# Altium footprint library TYCO SMD.PcbLib: 21 footprints (part 1 of 2)
Each footprint in its own frame and in the unit in brackets; x right, y up, seen from the top. Pads: shape width x height; smd on the part's side, far side on the other; paste and mask are expansions set on the pad; w line width, h text height; cw(c..) or ccw(c..) is an arc to the next point about the centre after c.
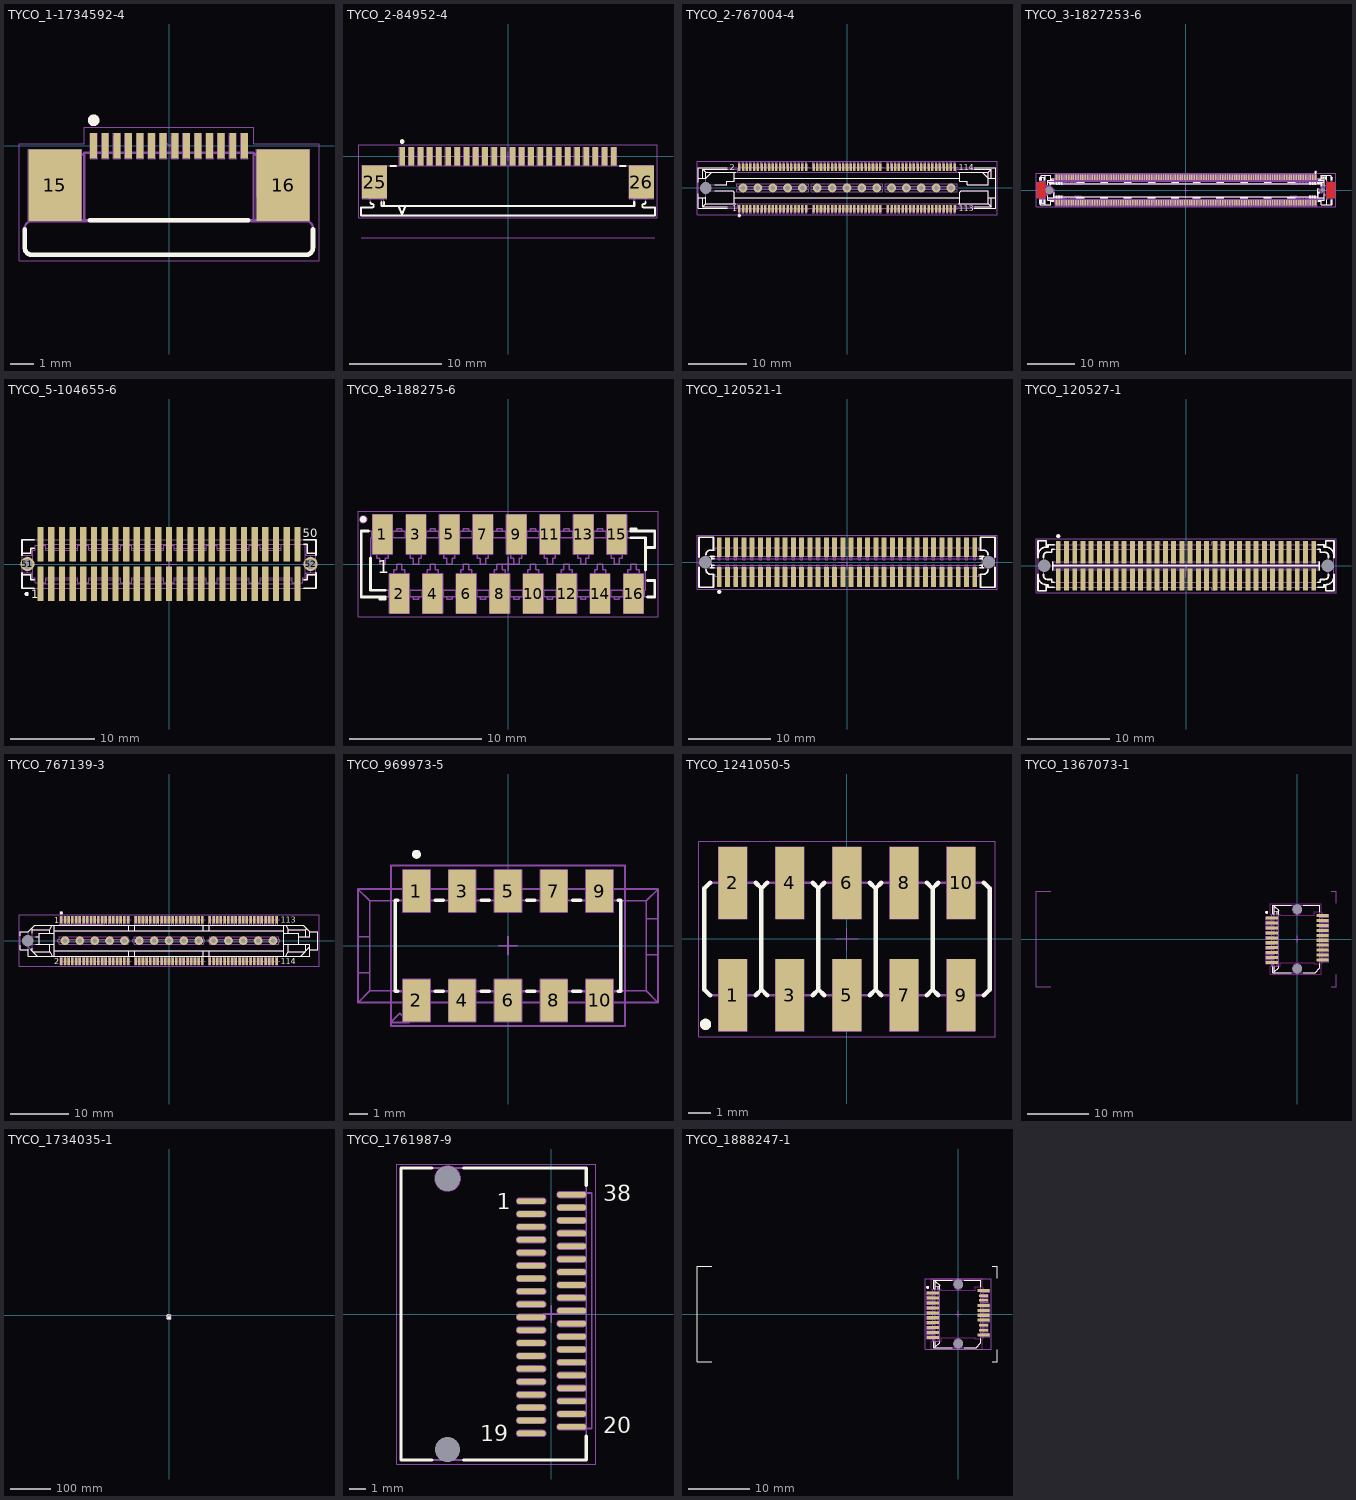
[diagram p0: the footprints below, top view; thin cyan lines are the x and y axes]

## TYCO_1-1734592-4 [mm] "14 Contacts, 0.5mm Pitch, FFC Right Angle Connector, Receptacle, ZIF, Bottom Contact Style, SMT"
height 2.05
pads (16):
  rect 0.3x1.1 smd: 1(-3.25,0) 2(-2.75,0) 3(-2.25,0) 4(-1.75,0) 5(-1.25,0) 6(-0.75,0) 7(-0.25,0) 8(0.25,0) 9(0.75,0) 10(1.25,0) 11(1.75,0) 12(2.25,0) 13(2.75,0) 14(3.25,0)
  rect 2.3x3.1 smd: 15(-4.92,-1.7) 16(4.92,-1.7)
Top Overlay:
  circle w0.25: c-3.25,1.1 r0.125
  lines w0.2: -6.22,-3.6 -6.22,-4.4 ccw(c-5.92,-4.4) -5.92,-4.7 5.91,-4.7 ccw(c5.91,-4.4) 6.21,-4.4 6.21,-3.6 ; -3.42,-3.21 3.42,-3.21
Mechanical 8:
  lines w0.05: -5.42,-1.7 -4.92,-1.7 ; -4.92,-2.2 -4.92,-1.7 ; -4.92,-1.2 -4.92,-1.7 ; -4.42,-1.7 -4.92,-1.7 ; -0.354,0.354 0,0 0.354,0.354 ; 4.42,-1.7 4.92,-1.7 ; 4.92,-2.2 4.92,-1.7 ; 4.92,-1.2 4.92,-1.7 ; 5.42,-1.7 4.92,-1.7 ; -3.4,-0.55 -3.1,-0.55 ; -3.4,-0.55 -3.4,0.55 -3.1,0.55 -3.1,-0.55 ; -3.4,-0.55 -3.25,0 -3.1,-0.55 ; -2.9,-0.55 -2.6,-0.55 ; -2.9,-0.55 -2.9,0.55 -2.6,0.55 -2.6,-0.55 ; -2.9,-0.55 -2.75,0 -2.6,-0.55 ; -2.4,-0.55 -2.1,-0.55 ; -2.4,-0.55 -2.4,0.55 -2.1,0.55 -2.1,-0.55 ; -2.4,-0.55 -2.25,0 -2.1,-0.55 ; -1.9,-0.55 -1.6,-0.55 ; -1.9,-0.55 -1.9,0.55 -1.6,0.55 -1.6,-0.55 ; -1.9,-0.55 -1.75,0 -1.6,-0.55 ; -1.4,-0.55 -1.1,-0.55 ; -1.4,-0.55 -1.4,0.55 -1.1,0.55 -1.1,-0.55 ; -1.4,-0.55 -1.25,0 -1.1,-0.55 ; -0.9,-0.55 -0.6,-0.55 ; -0.9,-0.55 -0.9,0.55 -0.6,0.55 -0.6,-0.55 ; -0.9,-0.55 -0.75,0 -0.6,-0.55 ; -0.4,-0.55 -0.1,-0.55 ; -0.4,-0.55 -0.4,0.55 -0.1,0.55 -0.1,-0.55 ; -0.4,-0.55 -0.25,0 -0.1,-0.55 ; 0.1,-0.55 0.4,-0.55 ; 0.1,-0.55 0.1,0.55 0.4,0.55 0.4,-0.55 ; 0.1,-0.55 0.25,0 0.4,-0.55 ; 0.6,-0.55 0.9,-0.55 ; 0.6,-0.55 0.6,0.55 0.9,0.55 0.9,-0.55 ; 0.6,-0.55 0.75,0 0.9,-0.55 ; 1.1,-0.55 1.4,-0.55 ; 1.1,-0.55 1.1,0.55 1.4,0.55 1.4,-0.55 ; 1.1,-0.55 1.25,0 1.4,-0.55 ; 1.6,-0.55 1.9,-0.55 ; 1.6,-0.55 1.6,0.55 1.9,0.55 1.9,-0.55 ; 1.6,-0.55 1.75,0 1.9,-0.55 ; 2.1,-0.55 2.4,-0.55 ; 2.1,-0.55 2.1,0.55 2.4,0.55 2.4,-0.55 ; 2.1,-0.55 2.25,0 2.4,-0.55 ; 2.6,-0.55 2.9,-0.55 ; 2.6,-0.55 2.6,0.55 2.9,0.55 2.9,-0.55 ; 2.6,-0.55 2.75,0 2.9,-0.55 ; 3.1,-0.55 3.4,-0.55 ; 3.1,-0.55 3.1,0.55 3.4,0.55 3.4,-0.55 ; 3.1,-0.55 3.25,0 3.4,-0.55 ; -6.07,-3.25 -3.77,-3.25 -3.77,-0.15 -6.07,-0.15 -6.07,-3.25 ; 3.77,-3.25 6.07,-3.25 6.07,-0.15 3.77,-0.15 3.77,-3.25
Mechanical 14:
  lines w0.1: -5.375,-3.25 -5.375,-0.3 ; -5.375,-3.21 5.365,-3.21 ; -5.375,-3.1 -5.47,-3.1 cw(c-5.47,-3) -5.57,-3 -5.57,-2.7 -5.42,-2.55 -5.42,-2.15 -5.57,-2 -5.57,-0.4 cw(c-5.47,-0.4) -5.47,-0.3 -3.82,-0.3 -3.82,-0.95 ; -4.035,-2.15 -4.035,-0.45 -4.185,-0.3 -4.185,-2.15 -3.805,-2.15 -3.805,-0.45 -3.655,-0.3 ; -4.035,-0.95 -3.805,-0.95 ; -3.655,-3.21 -3.655,-0.3 ; -3.35,-0.3 -3.35,0.4 -3.15,0.4 -3.15,-0.3 ; -2.85,-0.3 -2.85,0.4 -2.65,0.4 -2.65,-0.3 ; -2.35,-0.3 -2.35,0.4 -2.15,0.4 -2.15,-0.3 ; -1.85,-0.3 -1.85,0.4 -1.65,0.4 -1.65,-0.3 ; -1.35,-0.3 -1.35,0.4 -1.15,0.4 -1.15,-0.3 ; -0.85,-0.3 -0.85,0.4 -0.65,0.4 -0.65,-0.3 ; -0.35,-0.3 -0.35,0.4 -0.15,0.4 -0.15,-0.3 ; 0.15,-0.3 0.15,0.4 0.35,0.4 0.35,-0.3 ; 0.65,-0.3 0.65,0.4 0.85,0.4 0.85,-0.3 ; 1.15,-0.3 1.15,0.4 1.35,0.4 1.35,-0.3 ; 1.65,-0.3 1.65,0.4 1.85,0.4 1.85,-0.3 ; 2.15,-0.3 2.15,0.4 2.35,0.4 2.35,-0.3 ; 2.65,-0.3 2.65,0.4 2.85,0.4 2.85,-0.3 ; 3.15,-0.3 3.15,0.4 3.35,0.4 3.35,-0.3 ; 3.645,-3.21 3.645,-0.3 ; 3.795,-0.95 4.025,-0.95 ; 3.81,-0.95 3.81,-0.3 5.46,-0.3 cw(c5.46,-0.4) 5.56,-0.4 5.56,-2 5.41,-2.15 5.41,-2.55 5.56,-2.7 5.56,-3 cw(c5.46,-3) 5.46,-3.1 5.365,-3.1 ; 4.025,-2.15 4.025,-0.45 4.175,-0.3 4.175,-2.15 3.795,-2.15 3.795,-0.45 3.645,-0.3 ; 5.365,-3.25 5.365,-0.3 ; -3.655,-0.3 3.645,-0.3 ; -6.22,-4.4 ccw(c-5.92,-4.4) -5.92,-4.7 5.91,-4.7 ccw(c5.91,-4.4) 6.21,-4.4 6.21,-3.55 ccw(c5.91,-3.55) 5.91,-3.25 -5.92,-3.25 ccw(c-5.92,-3.55) -6.22,-3.55 -6.22,-4.4
Mechanical 15:
  lines w0.05: -6.47,-4.95 -6.47,0.1 -3.65,0.1 -3.65,0.8 3.65,0.8 3.65,0.1 6.47,0.1 6.47,-4.95 -6.47,-4.95
3D body "TYCO_1-1734592-4.stp": height 2.05, standoff 0, extent -6.22,-4.71 6.21,0.4

## TYCO_2-84952-4 [mm] "24 Contacts, 1mm Pitch, FFC Right Angle Connector, Receptacle, ZIF, Bottom Contact Style, SMT"
height 2.74
pads (26):
  rect 0.6x2 smd: 1(-11.5,0) 2(-10.5,0) 3(-9.5,0) 4(-8.5,0) 5(-7.5,0) 6(-6.5,0) 7(-5.5,0) 8(-4.5,0) 9(-3.5,0) 10(-2.5,0) 11(-1.5,0) 12(-0.5,0) 13(0.5,0) 14(1.5,0) 15(2.5,0) 16(3.5,0) 17(4.5,0) 18(5.5,0) 19(6.5,0) 20(7.5,0) 21(8.5,0) 22(9.5,0) 23(10.5,0) 24(11.5,0)
  rect 2.7x3.6 smd: 25(-14.5,-2.8) 26(14.5,-2.8)
Top Overlay:
  circle w0.25: c-11.5,1.6 r0.125
  lines w0.2: -14.945,-5.025 ccw(c-14.765,-5.025) -14.765,-5.205 cw(c-14.765,-5.385) -14.765,-5.565 -15.965,-5.565 -15.965,-6.455 15.965,-6.455 15.965,-5.565 14.765,-5.565 cw(c14.765,-5.385) 14.765,-5.205 ccw(c14.765,-5.025) 14.945,-5.025 14.945,-4.95 ; -13.755,-4.985 -13.755,-5.335 ccw(c-13.675,-5.335) -13.675,-5.415 -13.475,-5.415 ; -13.475,-4.95 -13.475,-5.425 13.675,-5.425 13.675,-4.95 ; -12.8,-1.045 -12.155,-1.045 ; -11.905,-5.425 -11.525,-6.305 -11.145,-5.425 ; 12.155,-1.045 12.8,-1.045 ; 13.675,-5.415 ccw(c13.675,-5.335) 13.755,-5.335 13.755,-4.985
Mechanical 8:
  drawing of 211 lines, arcs and shapes, not listed
Mechanical 14:
  drawing of 196 lines, arcs and shapes, not listed
Mechanical 15:
  lines w0.05: -16.215,-6.705 -16.215,1.25 16.215,1.25 16.215,-6.705 -16.215,-6.705
3D body "TYCO_2-84952-4.stp": height 2.56, standoff 0, extent -15.965,-6.455 15.965,0.085

## TYCO_2-767004-4 [mm] "114 Positions, Pitch 25 [0.64], Centerline Matched Impedance Vertical Receptacle (MICTOR)"
height 6.35
pads (130):
  rect 0.43x1.27 smd: 1(-18.415,-3.531) 2(-18.415,3.531) 3(-17.78,-3.531) 4(-17.78,3.531) 5(-17.145,-3.531) 6(-17.145,3.531) 7(-16.51,-3.531) 8(-16.51,3.531) 9(-15.875,-3.531) 10(-15.875,3.531) 11(-15.24,-3.531) 12(-15.24,3.531) 13(-14.605,-3.531) 14(-14.605,3.531) 15(-13.97,-3.531) 16(-13.97,3.531) 17(-13.335,-3.531) 18(-13.335,3.531) 19(-12.7,-3.531) 20(-12.7,3.531) 21(-12.065,-3.531) 22(-12.065,3.531) 23(-11.43,-3.531) 24(-11.43,3.531) 25(-10.795,-3.531) 26(-10.795,3.531) 27(-10.16,-3.531) 28(-10.16,3.531) 29(-9.525,-3.531) 30(-9.525,3.531) 31(-8.89,-3.531) 32(-8.89,3.531) 33(-8.255,-3.531) 34(-8.255,3.531) 35(-7.62,-3.531) 36(-7.62,3.531) 37(-6.985,-3.531) 38(-6.985,3.531) 39(-5.715,-3.531) 40(-5.715,3.531) 41(-5.08,-3.531) 42(-5.08,3.531) 43(-4.445,-3.531) 44(-4.445,3.531) 45(-3.81,-3.531) 46(-3.81,3.531) 47(-3.175,-3.531) 48(-3.175,3.531) 49(-2.54,-3.531) 50(-2.54,3.531) 51(-1.905,-3.531) 52(-1.905,3.531) 53(-1.27,-3.531) 54(-1.27,3.531) 55(-0.635,-3.531) 56(-0.635,3.531) 57(0,-3.531) 58(0,3.531) 59(0.635,-3.531) 60(0.635,3.531) 61(1.27,-3.531) 62(1.27,3.531) 63(1.905,-3.531) 64(1.905,3.531) 65(2.54,-3.531) 66(2.54,3.531) 67(3.175,-3.531) 68(3.175,3.531) 69(3.81,-3.531) 70(3.81,3.531) 71(4.445,-3.531) 72(4.445,3.531) 73(5.08,-3.531) 74(5.08,3.531) 75(5.715,-3.531) 76(5.715,3.531) 77(6.985,-3.531) 78(6.985,3.531) 79(7.62,-3.531) 80(7.62,3.531) 81(8.255,-3.531) 82(8.255,3.531) 83(8.89,-3.531) 84(8.89,3.531) 85(9.525,-3.531) 86(9.525,3.531) 87(10.16,-3.531) 88(10.16,3.531) 89(10.795,-3.531) 90(10.795,3.531) 91(11.43,-3.531) 92(11.43,3.531) 93(12.065,-3.531) 94(12.065,3.531) 95(12.7,-3.531) 96(12.7,3.531) 97(13.335,-3.531) 98(13.335,3.531) 99(13.97,-3.531) 100(13.97,3.531) 101(14.605,-3.531) 102(14.605,3.531) 103(15.24,-3.531) 104(15.24,3.531) 105(15.875,-3.531) 106(15.875,3.531) 107(16.51,-3.531) 108(16.51,3.531) 109(17.145,-3.531) 110(17.145,3.531) 111(17.78,-3.531) 112(17.78,3.531) 113(18.415,-3.531) 114(18.415,3.531)
  round 1.5 hole 0.8: 115(17.78,0) 116(15.24,0) 117(12.7,0) 118(10.16,0) 119(7.62,0) 120(5.08,0) 121(2.54,0) 122(0,0) 123(-2.54,0) 124(-5.08,0) 125(-7.62,0) 126(-10.16,0) 127(-12.7,0) 128(-15.24,0) 129(-17.78,0)
  round 0.5 hole 2 unplated mask+0.75: 130(-24.13,0)
Top Overlay:
  circle w0.25: c-18.415,-4.716 r0.125
  lines w0.2: -25.4,-1.676 -24.13,-1.676 ; -25.4,-0.973 -25.4,-3.454 -20.5,-3.454 ; -25.4,0.973 -25.4,3.454 -20.5,3.454 ; -25.4,1.676 -24.13,1.676 -23.114,2.692 ; -24.638,-1.676 -24.638,-3.2 ; -24.638,1.676 -24.638,3.2 ; -24.13,-1.6 -24.13,-2.692 ; -24.13,1.6 -24.13,2.692 ; -22.613,-0.508 -19.507,-0.508 -19.253,-0.762 -19.253,-2.692 ; -22.613,0.508 -20.523,0.508 -20.523,1.143 -19.253,1.143 -19.253,2.692 ; -20.5,-3.2 -24.638,-3.2 ; -20.5,3.2 -24.638,3.2 ; -19.253,-1.676 19.253,-1.676 ; -19.253,1.676 19.253,1.676 ; -19.03,-2.692 -24.13,-2.692 ; -19.03,2.692 -24.13,2.692 ; 19.03,-2.692 24.13,-2.692 ; 19.03,2.692 24.13,2.692 ; 19.253,-2.692 19.253,-0.762 19.507,-0.508 24.13,-0.508 24.13,-2.692 ; 19.253,2.692 19.253,1.143 20.523,1.143 20.523,0.508 24.13,0.508 24.13,2.692 ; 21.8,-3.454 25.4,-3.454 25.4,3.454 21.8,3.454 ; 21.8,-3.2 24.638,-3.2 ; 21.8,3.2 24.638,3.2 ; 23.114,2.692 24.13,1.676 25.4,1.676 ; 24.13,-1.676 25.4,-1.676 ; 24.638,-1.676 24.638,-3.2 ; 24.638,1.676 24.638,3.2 ; -24.638,-3.2 -24.13,-2.692 ; -24.638,3.2 -24.13,2.692 ; 24.13,-2.692 24.638,-3.2 ; 24.13,2.692 24.638,3.2
  text "114" at 19.075,3.05 h1
  text "113" at 19.1,-4.025 h1
  text "2" at -20.05,3.05 h1
  text "1" at -19.6,-4.025 h1
Mechanical 8:
  drawing of 406 lines, arcs and shapes, not listed
Mechanical 14:
  drawing of 415 lines, arcs and shapes, not listed
Mechanical 15:
  lines w0.05: -25.65,-4.606 -25.65,4.606 25.65,4.606 25.65,-4.606 -25.65,-4.606
3D body "TYCO_2-767004-4.stp": height 6.1, standoff -1.3, extent -25.4,-4.356 25.4,4.356

## TYCO_3-1827253-6 [mm] "220 Positions, 0.5mm Pitch, Surface Mount, Board-to-Board Plug Connector with Ground Plate"
height 4.45
pads (222):
  rect 0.45x1.2 smd: 1(27.325,2.7) 2(27.325,-2.7) 219(-27.325,2.7) 220(-27.325,-2.7)
  rect 0.3x1.2 smd: 3(26.75,2.7) 4(26.75,-2.7) 5(26.25,2.7) 6(26.25,-2.7) 7(25.75,2.7) 8(25.75,-2.7) 9(25.25,2.7) 10(25.25,-2.7) 11(24.75,2.7) 12(24.75,-2.7) 13(24.25,2.7) 14(24.25,-2.7) 15(23.75,2.7) 16(23.75,-2.7) 17(23.25,2.7) 18(23.25,-2.7) 19(22.75,2.7) 20(22.75,-2.7) 21(22.25,2.7) 22(22.25,-2.7) 23(21.75,2.7) 24(21.75,-2.7) 25(21.25,2.7) 26(21.25,-2.7) 27(20.75,2.7) 28(20.75,-2.7) 29(20.25,2.7) 30(20.25,-2.7) 31(19.75,2.7) 32(19.75,-2.7) 33(19.25,2.7) 34(19.25,-2.7) 35(18.75,2.7) 36(18.75,-2.7) 37(18.25,2.7) 38(18.25,-2.7) 39(17.75,2.7) 40(17.75,-2.7) 41(17.25,2.7) 42(17.25,-2.7) 43(16.75,2.7) 44(16.75,-2.7) 45(16.25,2.7) 46(16.25,-2.7) 47(15.75,2.7) 48(15.75,-2.7) 49(15.25,2.7) 50(15.25,-2.7) 51(14.75,2.7) 52(14.75,-2.7) 53(14.25,2.7) 54(14.25,-2.7) 55(13.75,2.7) 56(13.75,-2.7) 57(13.25,2.7) 58(13.25,-2.7) 59(12.75,2.7) 60(12.75,-2.7) 61(12.25,2.7) 62(12.25,-2.7) 63(11.75,2.7) 64(11.75,-2.7) 65(11.25,2.7) 66(11.25,-2.7) 67(10.75,2.7) 68(10.75,-2.7) 69(10.25,2.7) 70(10.25,-2.7) 71(9.75,2.7) 72(9.75,-2.7) 73(9.25,2.7) 74(9.25,-2.7) 75(8.75,2.7) 76(8.75,-2.7) 77(8.25,2.7) 78(8.25,-2.7) 79(7.75,2.7) 80(7.75,-2.7) 81(7.25,2.7) 82(7.25,-2.7) 83(6.75,2.7) 84(6.75,-2.7) 85(6.25,2.7) 86(6.25,-2.7) 87(5.75,2.7) 88(5.75,-2.7) 89(5.25,2.7) 90(5.25,-2.7) 91(4.75,2.7) 92(4.75,-2.7) 93(4.25,2.7) 94(4.25,-2.7) 95(3.75,2.7) 96(3.75,-2.7) 97(3.25,2.7) 98(3.25,-2.7) 99(2.75,2.7) 100(2.75,-2.7) 101(2.25,2.7) 102(2.25,-2.7) 103(1.75,2.7) 104(1.75,-2.7) 105(1.25,2.7) 106(1.25,-2.7) 107(0.75,2.7) 108(0.75,-2.7) 109(0.25,2.7) 110(0.25,-2.7) 111(-0.25,2.7) 112(-0.25,-2.7) 113(-0.75,2.7) 114(-0.75,-2.7) 115(-1.25,2.7) 116(-1.25,-2.7) 117(-1.75,2.7) 118(-1.75,-2.7) 119(-2.25,2.7) 120(-2.25,-2.7) 121(-2.75,2.7) 122(-2.75,-2.7) 123(-3.25,2.7) 124(-3.25,-2.7) 125(-3.75,2.7) 126(-3.75,-2.7) 127(-4.25,2.7) 128(-4.25,-2.7) 129(-4.75,2.7) 130(-4.75,-2.7) 131(-5.25,2.7) 132(-5.25,-2.7) 133(-5.75,2.7) 134(-5.75,-2.7) 135(-6.25,2.7) 136(-6.25,-2.7) 137(-6.75,2.7) 138(-6.75,-2.7) 139(-7.25,2.7) 140(-7.25,-2.7) 141(-7.75,2.7) 142(-7.75,-2.7) 143(-8.25,2.7) 144(-8.25,-2.7) 145(-8.75,2.7) 146(-8.75,-2.7) 147(-9.25,2.7) 148(-9.25,-2.7) 149(-9.75,2.7) 150(-9.75,-2.7) 151(-10.25,2.7) 152(-10.25,-2.7) 153(-10.75,2.7) 154(-10.75,-2.7) 155(-11.25,2.7) 156(-11.25,-2.7) 157(-11.75,2.7) 158(-11.75,-2.7) 159(-12.25,2.7) 160(-12.25,-2.7) 161(-12.75,2.7) 162(-12.75,-2.7) 163(-13.25,2.7) 164(-13.25,-2.7) 165(-13.75,2.7) 166(-13.75,-2.7) 167(-14.25,2.7) 168(-14.25,-2.7) 169(-14.75,2.7) 170(-14.75,-2.7) 171(-15.25,2.7) 172(-15.25,-2.7) 173(-15.75,2.7) 174(-15.75,-2.7) 175(-16.25,2.7) 176(-16.25,-2.7) 177(-16.75,2.7) 178(-16.75,-2.7) 179(-17.25,2.7) 180(-17.25,-2.7) 181(-17.75,2.7) 182(-17.75,-2.7) 183(-18.25,2.7) 184(-18.25,-2.7) 185(-18.75,2.7) 186(-18.75,-2.7) 187(-19.25,2.7) 188(-19.25,-2.7) 189(-19.75,2.7) 190(-19.75,-2.7) 191(-20.25,2.7) 192(-20.25,-2.7) 193(-20.75,2.7) 194(-20.75,-2.7) 195(-21.25,2.7) 196(-21.25,-2.7) 197(-21.75,2.7) 198(-21.75,-2.7) 199(-22.25,2.7) 200(-22.25,-2.7) 201(-22.75,2.7) 202(-22.75,-2.7) 203(-23.25,2.7) 204(-23.25,-2.7) 205(-23.75,2.7) 206(-23.75,-2.7) 207(-24.25,2.7) 208(-24.25,-2.7) 209(-24.75,2.7) 210(-24.75,-2.7) 211(-25.25,2.7) 212(-25.25,-2.7) 213(-25.75,2.7) 214(-25.75,-2.7) 215(-26.25,2.7) 216(-26.25,-2.7) 217(-26.75,2.7) 218(-26.75,-2.7)
  round 0.5 hole 1.6 unplated mask+0.55: MECH(-28.85,0)
  round 0.5 hole 0.9 unplated mask+0.2: MECH(28.85,0)
Top Layer:
  region: -31.4,-1.65 -31.4,1.65 -29.75,1.65 -29.75,0.436 -29.793,0.332 -29.844,0.113 -29.844,-0.113 -29.793,-0.332 -29.75,-0.436 -29.75,-1.65
  region: 31.4,1.65 31.4,-1.65 29.75,-1.65 29.75,-0.436 29.793,-0.332 29.844,-0.113 29.844,0.113 29.793,0.332 29.75,0.436 29.75,1.65
Top Overlay:
  drawing of 347 lines, arcs and shapes, not listed
Mechanical 8:
  drawing of 1362 lines, arcs and shapes, not listed
Mechanical 14:
  drawing of 1384 lines, arcs and shapes, not listed
Mechanical 15:
  lines w0.05: -31.65,-3.55 31.65,-3.55 31.65,3.55 -31.65,3.55 -31.65,-3.55
3D body "TYCO_3-1827253-6.stp": height 4.45, standoff -0.6, extent -30.9,-3.1 30.9,3.1

## TYCO_5-104655-6 [mm] "2x25 Position, 1.27mm Pitch, Surface Mount, AMPMODU Male Connector"
height 5.78
pads (52):
  rect 0.75x4.1 smd: 1(-15.24,-2.33) 2(-15.24,2.33) 3(-13.97,-2.33) 4(-13.97,2.33) 5(-12.7,-2.33) 6(-12.7,2.33) 7(-11.43,-2.33) 8(-11.43,2.33) 9(-10.16,-2.33) 10(-10.16,2.33) 11(-8.89,-2.33) 12(-8.89,2.33) 13(-7.62,-2.33) 14(-7.62,2.33) 15(-6.35,-2.33) 16(-6.35,2.33) 17(-5.08,-2.33) 18(-5.08,2.33) 19(-3.81,-2.33) 20(-3.81,2.33) 21(-2.54,-2.33) 22(-2.54,2.33) 23(-1.27,-2.33) 24(-1.27,2.33) 25(0,-2.33) 26(0,2.33) 27(1.27,-2.33) 28(1.27,2.33) 29(2.54,-2.33) 30(2.54,2.33) 31(3.81,-2.33) 32(3.81,2.33) 33(5.08,-2.33) 34(5.08,2.33) 35(6.35,-2.33) 36(6.35,2.33) 37(7.62,-2.33) 38(7.62,2.33) 39(8.89,-2.33) 40(8.89,2.33) 41(10.16,-2.33) 42(10.16,2.33) 43(11.43,-2.33) 44(11.43,2.33) 45(12.7,-2.33) 46(12.7,2.33) 47(13.97,-2.33) 48(13.97,2.33) 49(15.24,-2.33) 50(15.24,2.33)
  round 1.7 hole 1.2: 51(-16.79,0) 52(16.79,0)
Top Overlay:
  circle w0.25: c-16.889,-3.556 r0.125
  lines w0.2: -17.424,-1.27 -16.408,-1.27 -16.408,-1.867 -16.015,-1.867 ; -17.424,-1.077 -17.424,-2.858 -16.015,-2.858 ; -17.424,1.077 -17.424,2.858 -16.015,2.858 ; -17.424,1.27 -16.408,1.27 -16.408,1.867 -16.015,1.867 ; 16.015,-2.858 17.424,-2.858 17.424,-1.077 ; 16.015,-1.867 16.408,-1.867 16.408,-1.27 17.424,-1.27 ; 16.015,2.324 16.408,2.324 16.408,1.27 17.424,1.27 ; 16.015,2.858 17.424,2.858 17.424,1.077
  text "50" at 15.868,3.168 h1
  text "1" at -16.328,-4.081 h1
Mechanical 8:
  lines w0.1: -17.79,0 -16.79,0 ; -16.79,-1 -16.79,0 ; -16.79,1 -16.79,0 ; -15.79,0 -16.79,0 ; -15.24,-3.33 -15.24,-2.33 ; -15.24,-1.33 -15.24,-2.33 ; -15.24,1.33 -15.24,2.33 ; -15.24,3.33 -15.24,2.33 ; -13.97,-3.33 -13.97,-2.33 -13.97,-1.33 ; -13.97,1.33 -13.97,2.33 -13.97,3.33 ; -12.7,-3.33 -12.7,-2.33 -12.7,-1.33 ; -12.7,1.33 -12.7,2.33 -12.7,3.33 ; -11.43,-3.33 -11.43,-2.33 -11.43,-1.33 ; -11.43,1.33 -11.43,2.33 -11.43,3.33 ; -10.16,-3.33 -10.16,-2.33 -10.16,-1.33 ; -10.16,1.33 -10.16,2.33 -10.16,3.33 ; -8.89,-3.33 -8.89,-2.33 -8.89,-1.33 ; -8.89,1.33 -8.89,2.33 -8.89,3.33 ; -7.62,-3.33 -7.62,-2.33 -7.62,-1.33 ; -7.62,1.33 -7.62,2.33 -7.62,3.33 ; -6.35,-3.33 -6.35,-2.33 -6.35,-1.33 ; -6.35,1.33 -6.35,2.33 -6.35,3.33 ; -5.08,-3.33 -5.08,-2.33 -5.08,-1.33 ; -5.08,1.33 -5.08,2.33 -5.08,3.33 ; -3.81,-3.33 -3.81,-2.33 -3.81,-1.33 ; -3.81,1.33 -3.81,2.33 -3.81,3.33 ; -2.54,-3.33 -2.54,-2.33 -2.54,-1.33 ; -2.54,1.33 -2.54,2.33 -2.54,3.33 ; -1.27,-3.33 -1.27,-2.33 -1.27,-1.33 ; -1.27,1.33 -1.27,2.33 -1.27,3.33 ; -1,0 0,0 ; 0,-3.33 0,-2.33 0,-1.33 ; 0,-1 0,0 ; 0,1 0,0 ; 0,1.33 0,2.33 0,3.33 ; 1,0 0,0 ; 1.27,-3.33 1.27,-2.33 1.27,-1.33 ; 1.27,1.33 1.27,2.33 1.27,3.33 ; 2.54,-3.33 2.54,-2.33 2.54,-1.33 ; 2.54,1.33 2.54,2.33 2.54,3.33 ; 3.81,-3.33 3.81,-2.33 3.81,-1.33 ; 3.81,1.33 3.81,2.33 3.81,3.33 ; 5.08,-3.33 5.08,-2.33 5.08,-1.33 ; 5.08,1.33 5.08,2.33 5.08,3.33 ; 6.35,-3.33 6.35,-2.33 6.35,-1.33 ; 6.35,1.33 6.35,2.33 6.35,3.33 ; 7.62,-3.33 7.62,-2.33 7.62,-1.33 ; 7.62,1.33 7.62,2.33 7.62,3.33 ; 8.89,-3.33 8.89,-2.33 8.89,-1.33 ; 8.89,1.33 8.89,2.33 8.89,3.33 ; 10.16,-3.33 10.16,-2.33 10.16,-1.33 ; 10.16,1.33 10.16,2.33 10.16,3.33 ; 11.43,-3.33 11.43,-2.33 11.43,-1.33 ; 11.43,1.33 11.43,2.33 11.43,3.33 ; 12.7,-3.33 12.7,-2.33 12.7,-1.33 ; 12.7,1.33 12.7,2.33 12.7,3.33 ; 13.97,-3.33 13.97,-2.33 13.97,-1.33 ; 13.97,1.33 13.97,2.33 13.97,3.33 ; 15.24,-3.33 15.24,-2.33 ; 15.24,-1.33 15.24,-2.33 ; 15.24,1.33 15.24,2.33 ; 15.24,3.33 15.24,2.33 ; 15.79,0 16.79,0 ; 16.79,-1 16.79,0 ; 16.79,1 16.79,0 ; 17.79,0 16.79,0 ; -15.24,-2.33 15.24,-2.33 ; -15.24,2.33 15.24,2.33
Mechanical 14:
  drawing of 297 lines, arcs and shapes, not listed
  text "50" at 15.868,3.168 h1
  text "1" at -16.328,-4.081 h1
3D body "TYCO_5-104655-6.stp": height 5.8, standoff -1.2, extent -17.405,-3.619 17.444,3.62

## TYCO_8-188275-6 [mm] "16 contacts, 1.27mm Centerline, Micro-MaTch Surface Mount, Board-Board & Ribbon-Board Female Connectors"
height 5.3
pads (16):
  rect 1.5x3 smd: 1(-9.525,2.25) 2(-8.255,-2.25) 3(-6.985,2.25) 4(-5.715,-2.25) 5(-4.445,2.25) 6(-3.175,-2.25) 7(-1.905,2.25) 8(-0.635,-2.25) 9(0.635,2.25) 10(1.905,-2.25) 11(3.175,2.25) 12(4.445,-2.25) 13(5.715,2.25) 14(6.985,-2.25) 15(8.255,2.25) 16(9.525,-2.25)
Top Overlay:
  circle w0.25: c-10.975,3.385 r0.125
  lines w0.2: -10.575,2.5 -11.125,2.5 -11.125,-2.5 -9.305,-2.5 ; -10.425,0.45 -10.425,-2 -9.305,-2 ; -9.725,-2.5 -9.725,-2.67 -9.325,-2.67 -9.325,-2.5 ; 9.305,2 10.425,2 10.425,-0.45 10.425,1.25 11.125,1.25 11.125,2.5 9.305,2.5 ; 9.325,2.5 9.325,2.67 9.725,2.67 9.725,2.5 ; 10.575,-2.5 11.125,-2.5 11.125,-1.25 10.575,-1.25
  text "1" at -9.875,-0.701 h1
Mechanical 8:
  drawing of 200 lines, arcs and shapes, not listed
Mechanical 14:
  drawing of 333 lines, arcs and shapes, not listed
  text "1" at -9.875,-0.701 h1
Mechanical 15:
  lines w0.025: -11.375,-4 -11.375,4 11.375,4 11.375,-4 -11.375,-4
3D body "TYCO_8-188275-6.stp": height 5.25, standoff 0, extent -11.125,-3.45 11.125,3.456

## TYCO_120521-1 [mm] "2x32 Position, 1mm Centerline, Surface Mount, Stacking Board-to-Board Female Connector (IEEE 1386 Mezzanine Connector)"
height 5.4
pads (66):
  rect 0.6x2.4 smd: 1(-15.5,-1.8) 2(-15.5,1.8) 3(-14.5,-1.8) 4(-14.5,1.8) 5(-13.5,-1.8) 6(-13.5,1.8) 7(-12.5,-1.8) 8(-12.5,1.8) 9(-11.5,-1.8) 10(-11.5,1.8) 11(-10.5,-1.8) 12(-10.5,1.8) 13(-9.5,-1.8) 14(-9.5,1.8) 15(-8.5,-1.8) 16(-8.5,1.8) 17(-7.5,-1.8) 18(-7.5,1.8) 19(-6.5,-1.8) 20(-6.5,1.8) 21(-5.5,-1.8) 22(-5.5,1.8) 23(-4.5,-1.8) 24(-4.5,1.8) 25(-3.5,-1.8) 26(-3.5,1.8) 27(-2.5,-1.8) 28(-2.5,1.8) 29(-1.5,-1.8) 30(-1.5,1.8) 31(-0.5,-1.8) 32(-0.5,1.8) 33(0.5,-1.8) 34(0.5,1.8) 35(1.5,-1.8) 36(1.5,1.8) 37(2.5,-1.8) 38(2.5,1.8) 39(3.5,-1.8) 40(3.5,1.8) 41(4.5,-1.8) 42(4.5,1.8) 43(5.5,-1.8) 44(5.5,1.8) 45(6.5,-1.8) 46(6.5,1.8) 47(7.5,-1.8) 48(7.5,1.8) 49(8.5,-1.8) 50(8.5,1.8) 51(9.5,-1.8) 52(9.5,1.8) 53(10.5,-1.8) 54(10.5,1.8) 55(11.5,-1.8) 56(11.5,1.8) 57(12.5,-1.8) 58(12.5,1.8) 59(13.5,-1.8) 60(13.5,1.8) 61(14.5,-1.8) 62(14.5,1.8) 63(15.5,-1.8) 64(15.5,1.8)
  round 0.5 hole 1.5 unplated mask+0.5: 65(-17.2,0) 66(17.2,0)
Top Overlay:
  circle w0.25: c-15.5,-3.6 r0.125
  lines w0.2: -17.95,-0.6 -17.95,-3.025 -16.2,-3.025 -16.2,-1.46 -16.56,-1.46 cw(c-16.56,-0.91) -17.11,-0.91 ; -17.95,0.6 -17.95,3.025 -16.2,3.025 -16.2,1.46 -16.56,1.46 ccw(c-16.56,0.91) -17.11,0.91 ; -16.6,-0.69 -16.1,-0.69 ; -16.6,0.69 -16.1,0.69 ; -16.4,-0.69 -16.4,-0.345 ; -16.4,-0.396 -16.1,-0.396 ; -16.4,0.345 -16.4,0.69 ; -16.4,0.396 -16.1,0.396 ; 16.1,-0.69 16.6,-0.69 ; 16.1,-0.396 16.4,-0.396 ; 16.1,0.396 16.4,0.396 ; 16.1,0.69 16.6,0.69 ; 16.4,-0.69 16.4,-0.345 ; 16.4,0.345 16.4,0.69 ; 17.11,-0.91 cw(c16.56,-0.91) 16.56,-1.46 16.2,-1.46 16.2,-3.025 17.95,-3.025 17.95,-0.6 ; 17.11,0.91 ccw(c16.56,0.91) 16.56,1.46 16.2,1.46 16.2,3.025 17.95,3.025 17.95,0.6
Mechanical 8:
  lines w0.1: -1,0 0,0 0,-1
Mechanical 14:
  drawing of 608 lines, arcs and shapes, not listed
Mechanical 15:
  lines w0.05: -18.2,-3.275 18.2,-3.275 18.2,3.275 -18.2,3.275 -18.2,-3.275
3D body "TYCO-AMP_120521-1.stp": height 5.4, standoff -0.73, extent -17.95,-3.025 17.95,3.025
